# Altium footprint library Generic Footprint.PcbLib: 160 footprints (part 10 of 20)
Each footprint in its own frame and in the unit in brackets; x right, y up, seen from the top. Pads: shape width x height; smd on the part's side, far side on the other; paste and mask are expansions set on the pad; w line width, h text height; cw(c..) or ccw(c..) is an arc to the next point about the centre after c.
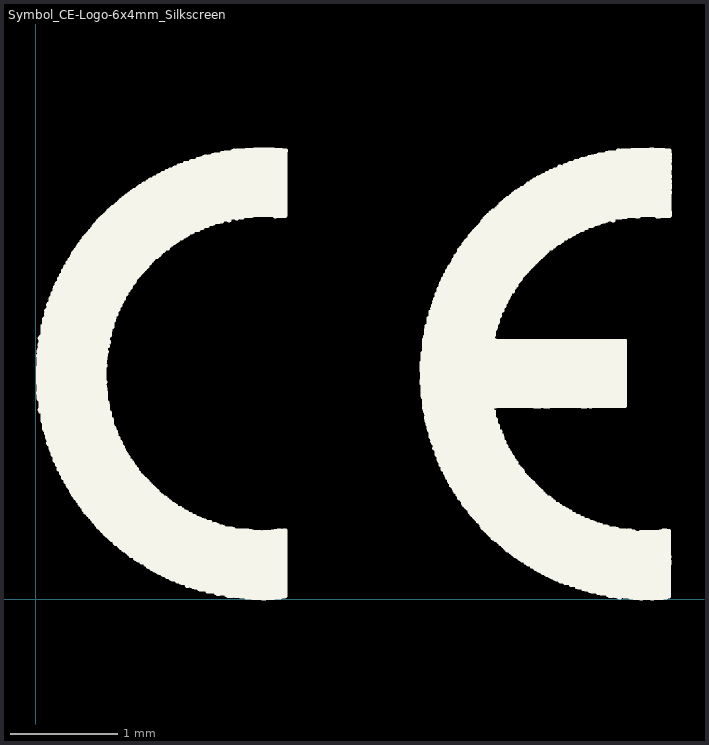
[diagram p9: the footprint, top view; thin cyan lines are the x and y axes]

## Symbol_CE-Logo-6x4mm_Silkscreen [mil]
pads (3108):
  round 1.57 on Top Overlay: 1(0.85,75.85) 1(0.85,79.4) 1(0.85,79.63) 1(0.85,79.87) 1(0.85,80.11) 1(0.85,80.34) 1(0.85,80.58) 1(0.85,80.81) 1(0.85,81.52) 1(0.85,81.76) 1(0.85,81.99) 1(0.85,82.23) 1(0.85,82.47) 1(0.85,82.7) 1(0.85,82.94) 1(0.85,83.18) 1(0.85,83.41) 1(0.85,83.65) 1(0.85,83.88) 1(0.85,84.12) 1(0.85,84.36) 1(0.85,84.59) 1(0.85,84.83) 1(0.85,85.07) 1(0.85,85.3) 1(0.85,89.55) 1(1.09,73.96) 1(1.09,74.2) 1(1.09,74.44) 1(1.09,74.67) 1(1.09,74.91) 1(1.09,76.09) 1(1.09,76.33) 1(1.09,76.56) 1(1.09,76.8) 1(1.09,77.03) 1(1.09,77.27) 1(1.09,77.51) 1(1.09,77.74) 1(1.09,77.98) 1(1.09,78.22) 1(1.09,78.45) 1(1.09,78.69) 1(1.09,78.92) 1(1.09,79.16) 1(1.09,81.05) 1(1.09,81.29) 1(1.09,85.54) 1(1.09,85.77) 1(1.09,86.01) 1(1.09,86.25) 1(1.09,86.48) 1(1.09,86.72) 1(1.09,86.96) 1(1.09,87.19) 1(1.09,87.43) 1(1.09,87.66) 1(1.09,87.9) 1(1.09,88.14) 1(1.09,88.37) 1(1.09,88.61) 1(1.09,88.85) 1(1.09,89.08) 1(1.09,89.32) 1(1.09,90.97) 1(1.09,91.21) 1(1.32,73.49) 1(1.32,73.73) 1(1.32,75.14) 1(1.32,75.38) 1(1.32,75.62) 1(1.32,89.79) 1(1.32,90.03) 1(1.32,90.26) 1(1.32,90.5) 1(1.32,90.74) 1(1.32,91.44) 1(1.32,91.68) 1(1.32,91.92) 1(1.56,69.71) 1(1.56,92.15) 1(1.56,93.33) 1(1.56,93.57) 1(1.56,93.81) 1(1.56,95.93) 1(1.79,69) 1(1.79,69.24) 1(1.79,69.48) 1(1.79,70.42) 1(1.79,70.66) 1(1.79,70.89) 1(1.79,71.13) 1(1.79,71.36) 1(1.79,71.6) 1(1.79,71.84) 1(1.79,72.07) 1(1.79,72.31) 1(1.79,72.55) 1(1.79,72.78) 1(1.79,73.02) 1(1.79,73.25) 1(1.79,92.39) 1(1.79,92.62) 1(1.79,92.86) 1(1.79,93.1) 1(1.79,94.04) 1(1.79,94.28) 1(1.79,94.51) 1(1.79,94.75) 1(1.79,94.99) 1(2.03,69.95) 1(2.03,70.18) 1(2.03,95.22) 1(2.03,95.46) 1(2.03,95.7) 1(2.03,96.17) 1(2.03,96.4) 1(2.03,96.64) 1(2.5,65.7) 1(2.5,65.93) 1(2.5,66.17) 1(2.5,66.4) 1(2.5,66.64) 1(2.5,66.88) 1(2.5,67.11) 1(2.5,67.35) 1(2.5,67.59) 1(2.5,67.82) 1(2.5,68.06) 1(2.5,68.29) 1(2.5,68.77) 1(2.5,96.88) 1(2.5,97.11) 1(2.5,97.35) 1(2.5,97.59) 1(2.5,97.82) 1(2.5,98.06) 1(2.5,98.29) 1(2.5,98.53) 1(2.5,98.77) 1(2.5,99) 1(2.5,99.24) 1(2.5,99.48) 1(2.5,100.42) 1(2.74,65.22) 1(2.74,65.46) 1(2.74,68.53) 1(2.74,99.71) 1(2.74,99.95) 1(2.74,100.18) 1(3.21,62.62) 1(3.21,63.1) 1(3.21,63.33) 1(3.21,63.57) 1(3.21,63.81) 1(3.21,64.04) 1(3.21,64.28) 1(3.21,64.51) 1(3.21,64.75) 1(3.21,64.99) 1(3.21,100.66) 1(3.21,100.89) 1(3.21,101.13) 1(3.21,101.36) 1(3.21,101.6) 1(3.21,101.84) 1(3.21,102.07) 1(3.21,102.31) 1(3.21,102.55) 1(3.21,103.02) 1(3.45,62.15) 1(3.45,62.39) 1(3.45,62.86) 1(3.45,102.78) 1(3.45,103.25) 1(3.68,103.49) 1(3.92,60.97) 1(3.92,61.21) 1(3.92,61.44) 1(3.92,61.92) 1(3.92,104.67) 1(3.92,104.91) 1(3.92,105.14) 1(3.92,106.09) 1(4.16,59.55) 1(4.16,59.79) 1(4.16,60.03) 1(4.16,60.26) 1(4.16,60.5) 1(4.16,60.73) 1(4.16,61.68) 1(4.16,103.73) 1(4.16,103.96) 1(4.16,104.2) 1(4.16,104.44) 1(4.16,105.38) 1(4.16,105.62) 1(4.16,105.85) 1(4.39,59.08) 1(4.39,59.32) 1(4.39,106.33) 1(4.39,106.56) 1(4.63,57.43) 1(4.63,108.22) 1(4.86,56.96) 1(4.86,57.19) 1(4.86,57.66) 1(4.86,57.9) 1(4.86,58.14) 1(4.86,58.37) 1(4.86,58.61) 1(4.86,58.85) 1(4.86,106.8) 1(4.86,107.03) 1(4.86,107.27) 1(4.86,107.51) 1(4.86,107.74) 1(4.86,107.98) 1(4.86,108.69) 1(5.1,56.72) 1(5.1,108.45) 1(5.57,55.3) 1(5.57,55.54) 1(5.57,55.77) 1(5.57,56.01) 1(5.57,56.25) 1(5.57,56.48) 1(5.57,108.92) 1(5.57,109.16) 1(5.57,109.4) 1(5.57,109.63) 1(5.57,109.87) 1(5.57,110.11) 1(5.57,110.34) 1(5.57,110.58) 1(5.81,54.59) 1(5.81,54.83) 1(5.81,55.07) 1(5.81,110.81) 1(5.81,111.05) 1(6.05,54.36) 1(6.28,53.18) 1(6.28,53.65) 1(6.28,54.12) 1(6.28,111.29) 1(6.28,111.52) 1(6.28,111.99) 1(6.28,112.47) 1(6.52,53.41) 1(6.52,53.88) 1(6.52,111.76) 1(6.52,112.23) 1(6.75,52.94) 1(6.99,51.05) 1(6.99,51.29) 1(6.99,51.52) 1(6.99,51.76) 1(6.99,51.99) 1(6.99,52.23) 1(6.99,52.47) 1(6.99,52.7) 1(6.99,112.7) 1(6.99,112.94) 1(6.99,113.18) 1(6.99,113.41) 1(6.99,113.65) 1(6.99,113.88) 1(6.99,114.12) 1(7.23,50.81) 1(7.23,114.36) 1(7.23,114.83) 1(7.46,50.58) 1(7.46,114.59) 1(7.7,115.07) 1(7.7,115.77) 1(7.94,49.4) 1(7.94,49.63) 1(7.94,49.87) 1(7.94,50.11) 1(7.94,50.34) 1(7.94,115.3) 1(7.94,115.54) 1(7.94,116.01) 1(7.94,116.25) 1(8.17,49.16) 1(8.41,47.74) 1(8.41,116.48) 1(8.64,47.98) 1(8.64,48.22) 1(8.64,48.45) 1(8.64,48.69) 1(8.64,48.92) 1(8.64,116.72) 1(8.64,116.96) 1(8.64,117.19) 1(8.64,117.43) 1(8.64,117.66) 1(8.64,117.9) 1(9.12,47.51) 1(9.35,46.33) 1(9.35,46.56) 1(9.35,46.8) 1(9.35,47.03) 1(9.35,47.27) 1(9.35,118.14) 1(9.35,118.37) 1(9.35,118.61) 1(9.35,118.85) 1(9.35,119.08) 1(9.59,46.09) 1(9.59,119.32) 1(10.06,44.67) 1(10.06,44.91) 1(10.06,45.14) 1(10.06,45.38) 1(10.06,45.62) 1(10.06,45.85) 1(10.06,119.55) 1(10.06,119.79) 1(10.06,120.03) 1(10.06,120.26) 1(10.06,120.5) 1(10.06,120.74) 1(10.3,120.97) 1(10.53,44.44) 1(10.77,44.2) 1(10.77,121.21) 1(10.77,121.44) 1(10.77,121.92) 1(11.01,43.25) 1(11.01,43.49) 1(11.01,43.73) 1(11.01,43.96) 1(11.01,121.68) 1(11.01,122.15) 1(11.01,122.39) 1(11.24,43.02) 1(11.72,42.07) 1(11.72,42.31) 1(11.72,42.55) 1(11.72,42.78) 1(11.72,122.62) 1(11.72,122.86) 1(11.72,123.1) 1(11.72,123.33) 1(11.72,123.57) 1(11.72,123.81) 1(11.95,41.6) 1(11.95,41.84) 1(12.19,124.04) 1(12.42,41.13) 1(12.42,41.36) 1(12.42,124.28) 1(12.42,124.51) 1(12.42,124.75) 1(12.66,40.89) 1(13.13,39.71) 1(13.13,39.95) 1(13.13,40.18) 1(13.13,40.42) 1(13.13,40.66) 1(13.13,124.99) 1(13.13,125.22) 1(13.13,125.46) 1(13.37,39.24) 1(13.37,39.48) 1(13.37,125.7) 1(13.37,125.93) 1(13.37,126.17) 1(13.84,38.29) 1(13.84,38.53) 1(13.84,38.77) 1(13.84,39) 1(13.84,126.4) 1(13.84,126.64) 1(13.84,126.88) 1(13.84,127.11) 1(13.84,127.35) 1(14.08,38.06) 1(14.08,127.59) 1(14.31,37.82) 1(14.31,127.82) 1(14.55,37.35) 1(14.55,37.59) 1(14.55,127.82) 1(14.79,37.11) 1(14.79,127.82) 1(14.79,128.06) 1(14.79,128.29) 1(14.79,128.53) 1(15.26,128.77) 1(15.49,36.17) 1(15.49,36.4) 1(15.49,36.64) 1(15.49,36.88) 1(15.49,129) 1(15.49,129.24) 1(15.49,129.48) 1(15.73,129.71) 1(15.73,129.95) 1(16.2,34.99) 1(16.2,35.22) 1(16.2,35.46) 1(16.2,35.7) 1(16.2,35.93) 1(16.2,130.18) 1(16.2,130.42) 1(16.2,130.66) 1(16.44,34.75) 1(16.91,34.28) 1(16.91,34.51) 1(16.91,130.89) 1(16.91,131.13) 1(16.91,131.6) 1(17.15,34.04) 1(17.15,131.36) 1(17.62,33.1) 1(17.62,33.33) 1(17.62,33.57) 1(17.62,33.81) 1(17.62,131.84) 1(17.62,132.07) 1(17.62,132.31) 1(17.62,132.55) 1(17.86,32.62) 1(17.86,32.86) 1(17.86,132.78) 1(17.86,133.02) 1(18.33,31.92) 1(18.33,32.39) 1(18.33,133.25) 1(18.57,32.15) 1(18.57,133.49) 1(18.57,133.73) 1(18.8,31.68) 1(19.27,30.97) 1(19.27,31.21) 1(19.27,31.44) 1(19.27,133.96) 1(19.27,134.2) 1(19.27,134.44) 1(19.51,134.67) 1(19.98,30.26) 1(19.98,30.5) 1(19.98,30.73) 1(19.98,134.91) 1(19.98,135.14) 1(19.98,135.38) 1(20.69,29.55) 1(20.69,29.79) 1(20.69,30.03) 1(20.69,135.62) 1(20.69,135.85) 1(20.69,136.09) 1(21.16,29.32) 1(21.4,28.61) 1(21.4,28.85) 1(21.4,29.08) 1(21.4,136.33) 1(21.4,136.56) 1(21.4,136.8) 1(21.4,137.03) 1(21.64,137.27) 1(21.64,137.51) 1(21.87,28.61) 1(22.11,27.9) 1(22.11,28.61) 1(22.11,137.74) 1(22.35,27.43) 1(22.35,27.66) 1(22.35,28.14) 1(22.35,28.37) 1(22.35,137.98) 1(22.35,138.22) 1(22.58,27.19) 1(22.58,138.45) 1(23.05,26.48) 1(23.05,26.72) 1(23.05,26.96) 1(23.05,138.69) 1(23.05,138.92) 1(23.05,139.16) 1(23.53,26.25) 1(23.76,139.4) 1(23.76,139.63) 1(23.76,139.87) 1(24,25.77) 1(24,26.01) 1(24.23,25.54) 1(24.47,25.07) 1(24.47,25.3) 1(24.47,140.11) 1(24.47,140.34) 1(24.47,140.58) 1(24.94,24.83) 1(25.18,24.59) 1(25.18,78.69) 1(25.18,78.92) 1(25.18,79.16) 1(25.18,79.4) 1(25.18,80.34) 1(25.18,80.58) 1(25.18,80.81) 1(25.18,81.05) 1(25.18,81.29) 1(25.18,81.52) 1(25.18,81.76) 1(25.18,81.99) 1(25.18,82.23) 1(25.18,82.47) 1(25.18,82.7) 1(25.18,82.94) 1(25.18,83.18) 1(25.18,83.41) 1(25.18,83.65) 1(25.18,83.88) 1(25.18,84.12) 1(25.18,84.36) 1(25.18,84.59) 1(25.18,84.83) 1(25.18,85.07) 1(25.18,85.3) 1(25.18,86.25) 1(25.18,86.48) 1(25.18,86.72) 1(25.18,86.96) 1(25.18,140.81) 1(25.18,141.05) 1(25.42,24.12) 1(25.42,24.36) 1(25.42,77.74) 1(25.42,77.98) 1(25.42,78.22) 1(25.42,78.45) 1(25.42,79.63) 1(25.42,80.11) 1(25.42,85.54) 1(25.42,87.19) 1(25.42,87.43) 1(25.42,87.66) 1(25.42,87.9) 1(25.42,88.14) 1(25.42,141.29) 1(25.65,75.38) 1(25.65,75.62) 1(25.65,75.85) 1(25.65,76.33) 1(25.65,76.56) 1(25.65,76.8) 1(25.65,77.03) 1(25.65,77.27) 1(25.65,77.51) 1(25.65,79.87) 1(25.65,85.77) 1(25.65,86.01) 1(25.65,88.37) 1(25.65,88.61) 1(25.65,88.85) 1(25.65,89.08) 1(25.65,89.32) 1(25.65,89.55) 1(25.65,90.03) 1(25.65,90.26) 1(25.65,90.5) 1(25.65,90.74) 1(25.65,91.68) 1(25.65,92.86) 1(25.89,72.55) 1(25.89,72.78) 1(25.89,73.02) 1(25.89,73.25) 1(25.89,73.49) 1(25.89,73.73) 1(25.89,73.96) 1(25.89,74.2) 1(25.89,74.44) 1(25.89,74.67) 1(25.89,74.91) 1(25.89,75.14) 1(25.89,76.09) 1(25.89,89.79) 1(25.89,91.21) 1(25.89,91.44) 1(25.89,91.92) 1(25.89,92.15) 1(25.89,92.39) 1(25.89,92.62) 1(25.89,141.52) 1(26.12,23.41) 1(26.12,23.65) 1(26.12,23.88) 1(26.12,90.97) 1(26.12,93.1) 1(26.12,141.76) 1(26.12,141.99) 1(26.36,70.89) 1(26.36,71.6) 1(26.36,71.84) 1(26.36,72.07) 1(26.36,72.31) 1(26.36,93.1) 1(26.36,93.33) 1(26.36,93.57) 1(26.36,93.81) 1(26.36,142.23) 1(26.6,68.77) 1(26.6,69) 1(26.6,69.24) 1(26.6,69.48) 1(26.6,69.71) 1(26.6,69.95) 1(26.6,70.18) 1(26.6,70.42) 1(26.6,70.66) 1(26.6,71.13) 1(26.6,71.36) 1(26.6,93.1) 1(26.6,94.04) 1(26.6,94.99) 1(26.6,95.22) 1(26.6,95.46) 1(26.6,95.7) 1(26.6,95.93) 1(26.6,96.17) 1(26.6,96.4) 1(26.6,96.64) 1(26.83,22.94) 1(26.83,23.18) 1(26.83,94.28) 1(26.83,94.51) 1(26.83,94.75) 1(26.83,96.88) 1(26.83,142.47) 1(26.83,142.7) 1(26.83,142.94) 1(27.07,22.7) 1(27.07,68.29) 1(27.07,97.59) 1(27.31,22.47) 1(27.31,66.4) 1(27.31,66.64) 1(27.31,66.88) 1(27.31,67.11) 1(27.31,67.35) 1(27.31,67.59) 1(27.31,67.82) 1(27.31,68.06) 1(27.31,68.53) 1(27.31,97.11) 1(27.31,97.35) 1(27.31,97.82) 1(27.31,98.06) 1(27.31,98.29) 1(27.31,98.53) 1(27.31,98.77) 1(27.31,99.71) 1(27.54,22.23) 1(27.54,99) 1(27.54,99.24) 1(27.54,99.48) 1(27.54,143.18) 1(27.54,143.41) 1(27.78,21.99) 1(27.78,65.7) 1(27.78,65.93) 1(27.78,99.95) 1(27.78,143.65) 1(28.01,21.76) 1(28.01,63.57) 1(28.01,64.04) 1(28.01,64.28) 1(28.01,64.51) 1(28.01,64.75) 1(28.01,64.99) 1(28.01,65.22) 1(28.01,65.46) 1(28.01,66.17) 1(28.01,100.42) 1(28.01,101.13) 1(28.01,101.36) 1(28.01,101.6) 1(28.25,63.33) 1(28.25,63.81) 1(28.25,100.18) 1(28.25,100.66) 1(28.25,100.89) 1(28.25,101.84) 1(28.25,102.07) 1(28.25,143.88) 1(28.25,144.12) 1(28.49,102.31) 1(28.72,62.15) 1(28.72,62.86) 1(28.72,63.1) 1(28.72,102.55) 1(28.72,102.78) 1(28.72,103.02) 1(28.72,103.25) 1(28.72,103.73) 1(28.72,104.2) 1(28.72,144.36) 1(28.96,21.05) 1(28.96,61.92) 1(28.96,62.39) 1(28.96,62.62) 1(28.96,103.49) 1(28.96,103.96) 1(28.96,104.44) 1(29.2,20.58) 1(29.2,20.81) 1(29.2,21.29) 1(29.2,21.52) 1(29.43,20.34) 1(29.43,59.79) 1(29.43,60.26) 1(29.43,60.97) 1(29.43,61.21) 1(29.43,61.44) 1(29.43,61.68) 1(29.43,104.91) 1(29.43,105.62) 1(29.67,59.55) 1(29.67,60.03) 1(29.67,60.5) 1(29.67,60.73) 1(29.67,104.67) 1(29.67,105.14) 1(29.67,105.38) 1(29.67,105.85) 1(29.67,144.59) 1(29.67,145.07) 1(29.9,106.09) 1(29.9,144.83) 1(29.9,145.3) 1(30.14,106.33) 1(30.38,58.14) 1(30.38,58.37) 1(30.38,58.61) 1(30.38,58.85) 1(30.38,59.08) 1(30.38,59.32) 1(30.38,106.56) 1(30.38,106.8) 1(30.38,107.03) 1(30.38,107.27) 1(30.61,19.63) 1(30.61,19.87) 1(30.61,20.11) 1(30.61,107.51) 1(30.61,145.54) 1(30.61,145.77) 1(30.61,146.01) 1(30.85,107.74) 1(31.09,56.72) 1(31.09,56.96) 1(31.09,57.19) 1(31.09,57.66) 1(31.09,57.9) 1(31.09,107.98) 1(31.09,108.22) 1(31.09,108.45) 1(31.09,108.69) 1(31.32,18.92) 1(31.32,19.16) 1(31.32,19.4) 1(31.32,56.48) 1(31.32,57.43) 1(31.32,108.92) 1(31.32,146.25) 1(31.32,146.48) 1(31.32,146.72) 1(31.56,109.16) 1(31.79,18.69) 1(31.79,56.25) 1(31.79,109.4) 1(31.79,109.63) 1(31.79,109.87) 1(32.03,18.45) 1(32.03,55.07) 1(32.03,55.3) 1(32.03,55.54) 1(32.03,55.77) 1(32.03,56.01) 1(32.03,110.11) 1(32.03,110.34) 1(32.03,146.96) 1(32.27,18.22) 1(32.27,147.19) 1(32.27,147.43) 1(32.5,17.98) 1(32.5,53.88) 1(32.5,54.36) 1(32.5,54.59) 1(32.5,54.83) 1(32.5,110.58) 1(32.5,110.81) 1(32.5,111.05) 1(32.5,111.29) 1(32.5,111.52) 1(32.74,17.98) 1(32.74,53.65) 1(32.74,54.12) 1(32.74,111.76) 1(32.74,111.99) 1(32.74,147.66) 1(32.98,17.98) 1(32.98,147.9) 1(33.21,17.98) 1(33.21,52.94) 1(33.21,53.41) 1(33.21,112.23) 1(33.21,148.14) 1(33.45,17.98) 1(33.45,52.7) 1(33.45,53.18) 1(33.45,112.47) 1(33.45,112.7) 1(33.45,112.94) 1(33.45,113.18) 1(33.45,113.41) 1(33.45,148.37) 1(33.68,17.27) 1(33.68,17.51) 1(33.68,17.74) 1(33.68,148.37) 1(33.92,17.27) 1(33.92,52.47) 1(34.16,17.27) 1(34.16,51.29) 1(34.16,51.52) 1(34.16,51.76) 1(34.16,51.99) 1(34.16,52.23) 1(34.16,113.65) 1(34.16,113.88) 1(34.16,114.12) 1(34.39,16.56) 1(34.39,16.8) 1(34.39,17.03) 1(34.39,114.36) 1(34.39,148.37) 1(34.39,148.61) 1(34.39,148.85) 1(34.39,149.08) 1(34.86,50.81) 1(34.86,51.05) 1(34.86,114.59) 1(34.86,114.83) 1(35.1,15.85) 1(35.1,16.09) 1(35.1,16.33) 1(35.1,50.58) 1(35.1,115.07) 1(35.1,115.3) 1(35.1,115.54) 1(35.1,115.77) 1(35.1,149.32) 1(35.1,149.55) 1(35.34,50.34) 1(35.34,149.79) 1(35.57,49.4) 1(35.57,49.87) 1(35.57,50.11) 1(35.57,116.01) 1(35.81,48.92) 1(35.81,49.16) 1(35.81,49.63) 1(35.81,116.25) 1(35.81,116.48) 1(35.81,116.72) 1(36.05,116.72) 1(36.05,150.03) 1(36.05,150.26) 1(36.28,116.72) 1(36.28,116.96) 1(36.28,117.43) 1(36.28,117.9) 1(36.28,150.5) 1(36.52,15.14) 1(36.52,15.62) 1(36.52,48.22) 1(36.52,48.45) 1(36.52,48.69) 1(36.52,117.19) 1(36.52,117.66) 1(36.52,118.14) 1(36.75,14.91) 1(36.75,15.38) 1(36.99,47.98) 1(37.23,46.8) 1(37.23,47.03) 1(37.23,47.27) 1(37.23,47.51) 1(37.23,47.74) 1(37.23,118.37) 1(37.23,118.61) 1(37.46,14.44) 1(37.46,14.67) 1(37.46,46.56) 1(37.46,118.85) 1(37.46,150.74) 1(37.46,150.97) 1(37.46,151.21) 1(37.7,46.56) 1(37.7,151.44) 1(37.94,14.2) 1(37.94,46.09) 1(37.94,46.33) 1(37.94,46.56) 1(37.94,119.08) 1(37.94,119.32) 1(37.94,119.55) 1(37.94,151.44) 1(38.17,45.85) 1(38.17,151.44) 1(38.17,151.68) 1(38.41,119.79) 1(38.41,151.92) 1(38.64,45.62) 1(38.64,120.03) 1(38.88,13.73) 1(38.88,13.96) 1(38.88,45.14) 1(38.88,45.38) 1(38.88,120.26) 1(39.12,13.49) 1(39.12,120.5) 1(39.35,44.91) 1(39.35,120.74) 1(39.59,44.44) 1(39.59,44.67) 1(39.59,120.97) 1(39.59,121.21) 1(39.59,152.62) 1(39.83,152.15) 1(39.83,152.39) 1(39.83,152.86) 1(40.06,121.44) 1(40.3,43.73) 1(40.3,43.96) 1(40.3,44.2) 1(40.3,121.68) 1(40.3,121.92) 1(40.53,12.78) 1(40.53,13.02) 1(40.53,13.25) 1(40.77,122.15) 1(41.01,42.78) 1(41.01,43.02) 1(41.01,43.25) 1(41.01,43.49) 1(41.01,122.39) 1(41.01,122.62) 1(41.01,122.86) 1(41.01,123.1) 1(41.01,123.33) 1(41.24,12.07) 1(41.24,12.31) 1(41.24,12.55) 1(41.24,123.57) 1(41.24,153.1) 1(41.24,153.33) 1(41.24,153.57) 1(41.48,123.57) 1(41.72,11.84) 1(41.72,42.07) 1(41.72,42.55) 1(41.72,123.81) 1(41.72,124.04) 1(41.95,42.31) 1(41.95,123.57) 1(41.95,124.28) 1(41.95,153.81) 1(41.95,154.04) 1(42.19,11.84) 1(42.19,124.28) 1(42.19,154.28) 1(42.42,41.6) 1(42.42,41.84) 1(42.42,124.28) 1(42.42,124.75) 1(42.66,11.13) 1(42.66,11.36) 1(42.66,11.84) 1(42.66,41.36) 1(42.66,124.51) 1(42.66,124.99) 1(42.9,11.6) 1(43.13,41.13) 1(43.13,125.46) 1(43.37,40.89) 1(43.37,125.22) 1(43.37,125.7) 1(43.6,10.66) 1(43.6,10.89) 1(43.6,40.66) 1(43.6,154.51) 1(43.6,154.75) 1(43.6,154.99) 1(43.84,40.42) 1(44.08,39.95) 1(44.08,40.18) 1(44.31,10.42) 1(44.55,125.93) 1(44.79,39.24) 1(44.79,39.48) 1(44.79,39.71) 1(44.79,126.17) 1(44.79,126.4) 1(45.02,9.95) 1(45.02,10.18) 1(45.02,39) 1(45.02,155.22) 1(45.02,155.46) 1(45.02,155.7) 1(45.49,9.71) 1(45.49,38.29) 1(45.49,38.53) 1(45.49,38.77) 1(45.49,126.64) 1(45.49,126.88) 1(45.49,127.11) 1(45.49,155.93) 1(45.73,127.35) 1(46.2,37.82) 1(46.2,127.59) 1(46.2,127.82) 1(46.2,155.93) 1(46.44,9.48) 1(46.44,37.59) 1(46.44,38.06) 1(46.44,155.93) 1(46.44,156.17) 1(46.44,156.4) 1(46.68,9.24) 1(46.68,156.64) 1(46.91,9) 1(46.91,128.06) 1(46.91,128.53) 1(47.15,128.29) 1(47.15,128.77) 1(47.62,37.35) 1(47.86,8.77) 1(47.86,36.88) 1(47.86,37.11) 1(48.09,8.53) 1(48.09,156.88) 1(48.09,157.11) 1(48.09,157.35) 1(48.33,8.29) 1(48.33,36.64) 1(48.57,36.17) 1(48.57,36.4) 1(48.57,129) 1(48.57,129.24) 1(48.57,129.48) 1(48.8,35.93) 1(49.04,35.93) 1(49.04,129.71) 1(49.27,8.06) 1(49.27,35.46) 1(49.27,35.93) 1(49.27,129.95) 1(49.27,130.18) 1(49.51,7.82) 1(49.51,35.22) 1(49.51,35.7) 1(49.51,157.59) 1(49.51,157.82) 1(49.51,158.06) 1(49.75,7.59) 1(49.98,130.42) 1(49.98,130.66) 1(50.22,7.35) 1(50.22,130.89) 1(50.46,7.35) 1(50.46,131.13) 1(50.69,7.35) 1(50.69,34.99) 1(50.69,131.13) 1(50.93,34.75) 1(50.93,131.13) 1(50.93,158.29) 1(50.93,158.53) 1(51.16,34.51) 1(51.4,131.36) 1(51.4,158.77) 1(51.64,33.81) 1(51.64,34.04) 1(51.64,34.28) 1(51.64,131.6) 1(51.64,131.84) 1(51.87,6.88) 1(51.87,7.11) 1(51.87,131.84) 1(52.11,6.64) 1(52.11,131.84) 1(52.35,132.07) 1(52.35,132.31) 1(52.58,33.57) 1(52.58,132.55) 1(52.58,159) 1(52.58,159.24) 1(52.58,159.48) 1(52.82,33.57) 1(53.05,33.1) 1(53.05,33.33) 1(53.05,33.57) 1(53.29,6.17) 1(53.29,6.4) 1(53.53,159.71) 1(53.76,32.39) 1(53.76,132.78) 1(54,5.93) 1(54,32.15) 1(54,32.62) 1(54,32.86) 1(54,133.02) 1(54,133.25) 1(54,159.71) 1(54.23,159.71) 1(54.71,133.49) 1(54.71,159.95) 1(54.94,32.15) 1(54.94,160.18) 1(54.94,160.42) 1(55.18,32.15) 1(55.18,160.42) 1(55.42,5.7) 1(55.42,31.44) 1(55.42,31.68) 1(55.42,133.73) 1(55.42,133.96) 1(55.42,160.42) 1(55.65,4.99) 1(55.65,5.22) 1(55.65,5.46) 1(55.65,31.92) 1(55.89,134.2) 1(56.12,4.99) 1(56.12,134.44) 1(56.12,134.67) 1(56.36,134.91) 1(56.6,134.91) 1(57.07,4.99) 1(57.07,30.73) 1(57.07,30.97) 1(57.07,31.21) 1(57.07,160.66) 1(57.07,160.89) 1(57.31,4.99) 1(57.31,134.91) 1(57.31,161.13) 1(57.54,4.99) 1(57.54,135.38) 1(57.54,161.13) 1(57.78,135.14) 1(57.78,135.62) 1(57.78,161.13) 1(58.01,4.51) 1(58.01,4.75) 1(58.49,30.03) 1(58.49,30.26) 1(58.49,30.5) 1(58.72,4.28) 1(59.43,161.36) 1(59.43,161.6) 1(59.67,29.79) 1(59.67,161.84) 1(59.9,135.85) 1(59.9,136.09) 1(60.14,3.81) 1(60.14,4.04) 1(60.14,136.33) 1(60.38,29.55) 1(60.61,3.57) 1(60.61,29.32) 1(60.85,3.57) 1(60.85,162.07) 1(61.09,3.57) 1(61.09,162.07) 1(61.32,136.56) 1(61.32,136.8) 1(61.56,29.08) 1(61.56,137.03) 1(61.56,162.07) 1(61.56,162.31) 1(62.27,28.37) 1(62.27,28.61) 1(62.27,28.85) 1(62.27,162.55) 1(62.27,162.78) 1(62.5,162.78) 1(62.74,137.27) 1(62.98,28.37) 1(62.98,137.27) 1(62.98,137.51) 1(62.98,137.74) 1(63.21,2.86) 1(63.21,3.1) 1(63.21,3.33) 1(63.21,28.37) 1(63.21,137.27) 1(63.21,137.98) 1(63.45,137.98) 1(63.68,2.86) 1(63.68,162.78) 1(63.92,2.86) 1(63.92,28.37) 1(63.92,162.78) 1(64.16,28.14) 1(64.16,28.37) 1(64.39,27.66) 1(64.39,27.9) 1(64.63,137.98) 1(64.63,162.78) 1(64.86,163.02) 1(65.1,163.25) 1(65.34,138.22) 1(65.34,138.45) 1(65.57,138.69) 1(65.81,27.66) 1(65.81,138.69) 1(66.05,27.43) 1(66.05,27.66) 1(66.05,138.69) 1(66.05,163.49) 1(66.28,2.39) 1(66.28,2.62) 1(66.28,138.69) 1(66.75,138.69) 1(66.99,1.92) 1(66.99,2.15) 1(66.99,26.96) 1(66.99,27.19) 1(66.99,138.69) 1(67.23,1.92) 1(67.23,138.69) 1(67.94,138.92) 1(68.17,138.92) 1(68.41,26.72) 1(68.41,138.92) 1(68.41,139.16) 1(68.41,139.4) 1(68.41,163.96) 1(68.64,163.73) 1(69.12,26.25) 1(69.12,26.48) 1(69.59,164.2) 1(70.06,1.68) 1(70.06,1.92) 1(70.77,1.21) 1(70.77,1.44) 1(70.77,139.63) 1(71.01,1.21) 1(71.01,139.4) 1(71.01,139.63) 1(71.24,139.4) 1(71.24,139.63) 1(71.24,139.87) 1(71.48,140.11) 1(71.95,1.21) 1(71.95,26.01) 1(72.19,1.21) 1(72.42,164.44) 1(72.42,164.67) 1(72.66,25.77) 1(72.9,25.54) 1(72.9,164.91) 1(73.13,1.21) 1(73.13,25.3) 1(73.13,164.91) 1(73.37,25.3) 1(73.6,140.34) 1(73.84,1.21) 1(73.84,25.3) 1(73.84,140.11) 1(73.84,140.34) 1(74.08,140.11) 1(74.08,140.34) 1(74.08,164.91) 1(74.31,1.21) 1(74.31,25.3) 1(74.55,1.21) 1(74.79,1.21) 1(75.49,0.97) 1(75.49,25.3) 1(75.49,140.34) 1(75.73,25.3) 1(75.97,140.34) 1(75.97,140.58) 1(75.97,140.81) 1(76.2,25.3) 1(77.15,25.3) 1(77.38,0.73) 1(77.38,165.14) 1(77.86,25.07) 1(77.86,25.3) 1(78.09,141.05) 1(78.33,141.05) 1(78.33,165.14) 1(78.8,25.07) 1(79.04,25.07) 1(79.04,141.05) 1(79.27,141.05) 1(79.27,165.14) 1(79.51,141.05) 1(79.75,0.5) 1(79.75,24.83) 1(79.75,165.14) 1(79.98,24.59) 1(80.69,24.59) 1(80.69,165.14) 1(80.69,165.38) 1(81.4,24.59) 1(81.87,24.59) 1(82.82,24.59) 1(83.05,0.5) 1(83.29,0.5) 1(83.53,0.26) 1(83.76,0.26) 1(83.76,24.59) 1(84,0.26) 1(84.23,0.26) 1(85.89,24.59) 1(86.83,0.5) 1(86.83,24.59) 1(86.83,24.83) 1(87.07,0.5) 1(87.31,0.5) 1(87.31,165.38) 1(87.54,165.14) 1(88.01,25.07) 1(88.01,140.81) 1(88.01,141.05) 1(88.25,25.07) 1(88.25,140.81) 1(88.25,165.14) 1(88.49,141.05) 1(88.72,141.05) 1(88.96,165.14) 1(89.2,25.07) 1(89.2,25.3) 